# Altium integrated library WR-FPC_rev19a.IntLib: 242 symbols (part 1 of 2) (continued)
## 68712414022
designator J?
WR-FPC SMT ZIF Horizontal Top Contact, pitch 0.5mm, 24p; Part Number: 68712414022; Contact Resistance: 20mOhm; Pin Number: 24; Working Voltage: 50VAC; Rated Current: 0.5A; ComponentLink1Description: Manufacturer; ComponentLink1URL: http://www.we-online.de; ComponentLink2Description: Datasheet; ComponentLink2URL: https://katalog.we-online.com/em/datasheet/68712414022.pdf; Packaging: Tape and Reel; Pitch: 0.5mm; Published Date: November 2019; Mounting Technology: SMT; Operating Temperature: -25 to +85degC; Length: 18.4mm; Type: Horizontal; Publisher: Wurth Elektronik
footprint 68712414022
pins: 1, 2, 3, 4, 5, 6, 7, 8, 9, 10, 11, 12, 13, 14, 15, 16, 17, 18, 19, 20, 21, 22, 23, 24, MP1, MP2

## 68712414522
designator J?
WR-FPC SMT ZIF Horizontal Bottom Contact, pitch 0.5mm, 24p; Part Number: 68712414522; Contact Resistance: 20mOhm; Pin Number: 24; Working Voltage: 50VAC; Rated Current: 0.5A; ComponentLink1Description: Manufacturer; ComponentLink1URL: http://www.we-online.de; ComponentLink2Description: Datasheet; ComponentLink2URL: https://katalog.we-online.com/em/datasheet/68712414522.pdf; Packaging: Tape and Reel; Pitch: 0.5mm; Published Date: November 2019; Mounting Technology: SMT; Operating Temperature: -25 to +85degC; Length: 18.4mm; Type: Horizontal; Publisher: Wurth Elektronik
footprint 68712414522
pins: 1, 2, 3, 4, 5, 6, 7, 8, 9, 10, 11, 12, 13, 14, 15, 16, 17, 18, 19, 20, 21, 22, 23, 24, MP1, MP2

## 68712514022
designator J?
WR-FPC SMT ZIF Horizontal Top Contact, pitch 0.5mm, 25p; Part Number: 68712514022; Contact Resistance: 20mOhm; Pin Number: 25; Working Voltage: 50VAC; Rated Current: 0.5A; ComponentLink1Description: Manufacturer; ComponentLink1URL: http://www.we-online.de; ComponentLink2Description: Datasheet; ComponentLink2URL: https://katalog.we-online.com/em/datasheet/68712514022.pdf; Packaging: Tape and Reel; Pitch: 0.5mm; Published Date: November 2019; Mounting Technology: SMT; Operating Temperature: -25 to +85degC; Length: 18.9mm; Type: Horizontal; Publisher: Wurth Elektronik
footprint 68712514022
pins: 1, 2, 3, 4, 5, 6, 7, 8, 9, 10, 11, 12, 13, 14, 15, 16, 17, 18, 19, 20, 21, 22, 23, 24, 25, MP1, MP2

## 68712614022
designator J?
WR-FPC SMT ZIF Horizontal Top Contact, pitch 0.5mm, 26p; Part Number: 68712614022; Contact Resistance: 20mOhm; Pin Number: 26; Working Voltage: 50VAC; Rated Current: 0.5A; ComponentLink1Description: Manufacturer; ComponentLink1URL: http://www.we-online.de; ComponentLink2Description: Datasheet; ComponentLink2URL: https://katalog.we-online.com/em/datasheet/68712614022.pdf; Packaging: Tape and Reel; Pitch: 0.5mm; Published Date: November 2019; Mounting Technology: SMT; Operating Temperature: -25 to +85degC; Length: 19.4mm; Type: Horizontal; Publisher: Wurth Elektronik
footprint 68712614022
pins: 1, 2, 3, 4, 5, 6, 7, 8, 9, 10, 11, 12, 13, 14, 15, 16, 17, 18, 19, 20, 21, 22, 23, 24, 25, 26, MP1, MP2

## 68712614522
designator J?
WR-FPC SMT ZIF Horizontal Bottom Contact, pitch 0.5mm, 26p; Part Number: 68712614522; Contact Resistance: 20mOhm; Pin Number: 26; Working Voltage: 50VAC; Rated Current: 0.5A; ComponentLink1Description: Manufacturer; ComponentLink1URL: http://www.we-online.de; ComponentLink2Description: Datasheet; ComponentLink2URL: https://katalog.we-online.com/em/datasheet/68712614522.pdf; Packaging: Tape and Reel; Pitch: 0.5mm; Published Date: November 2019; Mounting Technology: SMT; Operating Temperature: -25 to +85degC; Length: 19.4mm; Type: Horizontal; Publisher: Wurth Elektronik
footprint 68712614522
pins: 1, 2, 3, 4, 5, 6, 7, 8, 9, 10, 11, 12, 13, 14, 15, 16, 17, 18, 19, 20, 21, 22, 23, 24, 25, 26, MP1, MP2

## 68712814022
designator J?
WR-FPC SMT ZIF Horizontal Top Contact, pitch 0.5mm, 28p; Part Number: 68712814022; Contact Resistance: 20mOhm; Pin Number: 28; Working Voltage: 50VAC; Rated Current: 0.5A; ComponentLink1Description: Manufacturer; ComponentLink1URL: http://www.we-online.de; ComponentLink2Description: Datasheet; ComponentLink2URL: https://katalog.we-online.com/em/datasheet/68712814022.pdf; Packaging: Tape and Reel; Pitch: 0.5mm; Published Date: November 2019; Mounting Technology: SMT; Operating Temperature: -25 to +85degC; Length: 20.4mm; Type: Horizontal; Publisher: Wurth Elektronik
footprint 68712814022
pins: 1, 2, 3, 4, 5, 6, 7, 8, 9, 10, 11, 12, 13, 14, 15, 16, 17, 18, 19, 20, 21, 22, 23, 24, 25, 26, 27, 28, MP1, MP2

## 68712814522
designator J?
WR-FPC SMT ZIF Horizontal Bottom Contact, pitch 0.5mm, 28p; Part Number: 68712814522; Contact Resistance: 20mOhm; Pin Number: 28; Working Voltage: 50VAC; Rated Current: 0.5A; ComponentLink1Description: Manufacturer; ComponentLink1URL: http://www.we-online.de; ComponentLink2Description: Datasheet; ComponentLink2URL: https://katalog.we-online.com/em/datasheet/68712814522.pdf; Packaging: Tape and Reel; Pitch: 0.5mm; Published Date: November 2019; Mounting Technology: SMT; Operating Temperature: -25 to +85degC; Length: 20.4mm; Type: Horizontal; Publisher: Wurth Elektronik
footprint 68712814522
pins: 1, 2, 3, 4, 5, 6, 7, 8, 9, 10, 11, 12, 13, 14, 15, 16, 17, 18, 19, 20, 21, 22, 23, 24, 25, 26, 27, 28, MP1, MP2

## 68713014022
designator J?
WR-FPC SMT ZIF Horizontal Top Contact, pitch 0.5mm, 30p; Part Number: 68713014022; Contact Resistance: 20mOhm; Pin Number: 30; Working Voltage: 50VAC; Rated Current: 0.5A; ComponentLink1Description: Manufacturer; ComponentLink1URL: http://www.we-online.de; ComponentLink2Description: Datasheet; ComponentLink2URL: https://katalog.we-online.com/em/datasheet/68713014022.pdf; Packaging: Tape and Reel; Pitch: 0.5mm; Published Date: November 2019; Mounting Technology: SMT; Operating Temperature: -25 to +85degC; Length: 21.4mm; Type: Horizontal; Publisher: Wurth Elektronik
footprint 68713014022
pins: 1, 2, 3, 4, 5, 6, 7, 8, 9, 10, 11, 12, 13, 14, 15, 16, 17, 18, 19, 20, 21, 22, 23, 24, 25, 26, 27, 28, 29, 30, MP1, MP2

## 68713014522
designator J?
WR-FPC SMT ZIF Horizontal Bottom Contact, pitch 0.5mm, 30p; Part Number: 68713014522; Contact Resistance: 20mOhm; Pin Number: 30; Working Voltage: 50VAC; Rated Current: 0.5A; ComponentLink1Description: Manufacturer; ComponentLink1URL: http://www.we-online.de; ComponentLink2Description: Datasheet; ComponentLink2URL: https://katalog.we-online.com/em/datasheet/68713014522.pdf; Packaging: Tape and Reel; Pitch: 0.5mm; Published Date: November 2019; Mounting Technology: SMT; Operating Temperature: -25 to +85degC; Length: 21.4mm; Type: Horizontal; Publisher: Wurth Elektronik
footprint 68713014522
pins: 1, 2, 3, 4, 5, 6, 7, 8, 9, 10, 11, 12, 13, 14, 15, 16, 17, 18, 19, 20, 21, 22, 23, 24, 25, 26, 27, 28, 29, 30, MP1, MP2

## 68713214022
designator J?
WR-FPC SMT ZIF Horizontal Top Contact, pitch 0.5mm, 32p; Part Number: 68713214022; Contact Resistance: 20mOhm; Pin Number: 32; Working Voltage: 50VAC; Rated Current: 0.5A; ComponentLink1Description: Manufacturer; ComponentLink1URL: http://www.we-online.de; ComponentLink2Description: Datasheet; ComponentLink2URL: https://katalog.we-online.com/em/datasheet/68713214022.pdf; Packaging: Tape and Reel; Pitch: 0.5mm; Published Date: November 2019; Mounting Technology: SMT; Operating Temperature: -25 to +85degC; Length: 22.4mm; Type: Horizontal; Publisher: Wurth Elektronik
footprint 68713214022
pins: 1, 2, 3, 4, 5, 6, 7, 8, 9, 10, 11, 12, 13, 14, 15, 16, 17, 18, 19, 20, 21, 22, 23, 24, 25, 26, 27, 28, 29, 30, 31, 32, MP1, MP2

## 68713214522
designator J?
WR-FPC SMT ZIF Horizontal Bottom Contact, pitch 0.5mm, 32p; Part Number: 68713214522; Contact Resistance: 20mOhm; Pin Number: 32; Working Voltage: 50VAC; Rated Current: 0.5A; ComponentLink1Description: Manufacturer; ComponentLink1URL: http://www.we-online.de; ComponentLink2Description: Datasheet; ComponentLink2URL: https://katalog.we-online.com/em/datasheet/68713214522.pdf; Packaging: Tape and Reel; Pitch: 0.5mm; Published Date: November 2019; Mounting Technology: SMT; Operating Temperature: -25 to +85degC; Length: 22.4mm; Type: Horizontal; Publisher: Wurth Elektronik
footprint 68713214522
pins: 1, 2, 3, 4, 5, 6, 7, 8, 9, 10, 11, 12, 13, 14, 15, 16, 17, 18, 19, 20, 21, 22, 23, 24, 25, 26, 27, 28, 29, 30, 31, 32, MP1, MP2

## 68713314022
designator J?
WR-FPC SMT ZIF Horizontal Top Contact, pitch 0.5mm, 33p; Part Number: 68713314022; Contact Resistance: 20mOhm; Pin Number: 33; Working Voltage: 50VAC; Rated Current: 0.5A; ComponentLink1Description: Manufacturer; ComponentLink1URL: http://www.we-online.de; ComponentLink2Description: Datasheet; ComponentLink2URL: https://katalog.we-online.com/em/datasheet/68713314022.pdf; Packaging: Tape and Reel; Pitch: 0.5mm; Published Date: November 2019; Mounting Technology: SMT; Operating Temperature: -25 to +85degC; Length: 22.9mm; Type: Horizontal; Publisher: Wurth Elektronik
footprint 68713314022
pins: 1, 2, 3, 4, 5, 6, 7, 8, 9, 10, 11, 12, 13, 14, 15, 16, 17, 18, 19, 20, 21, 22, 23, 24, 25, 26, 27, 28, 29, 30, 31, 32, 33, MP1, MP2

## 68713314522
designator J?
WR-FPC SMT ZIF Horizontal Bottom Contact, pitch 0.5mm, 33p; Part Number: 68713314522; Contact Resistance: 20mOhm; Pin Number: 33; Working Voltage: 50VAC; Rated Current: 0.5A; ComponentLink1Description: Manufacturer; ComponentLink1URL: http://www.we-online.de; ComponentLink2Description: Datasheet; ComponentLink2URL: https://katalog.we-online.com/em/datasheet/68713314522.pdf; Packaging: Tape and Reel; Pitch: 0.5mm; Published Date: November 2019; Mounting Technology: SMT; Operating Temperature: -25 to +85degC; Length: 22.9mm; Type: Horizontal; Publisher: Wurth Elektronik
footprint 68713314522
pins: 1, 2, 3, 4, 5, 6, 7, 8, 9, 10, 11, 12, 13, 14, 15, 16, 17, 18, 19, 20, 21, 22, 23, 24, 25, 26, 27, 28, 29, 30, 31, 32, 33, MP1, MP2

## 68713414022
designator J?
WR-FPC SMT ZIF Horizontal Top Contact, pitch 0.5mm, 34p; Part Number: 68713414022; Contact Resistance: 20mOhm; Pin Number: 34; Working Voltage: 50VAC; Rated Current: 0.5A; ComponentLink1Description: Manufacturer; ComponentLink1URL: http://www.we-online.de; ComponentLink2Description: Datasheet; ComponentLink2URL: https://katalog.we-online.com/em/datasheet/68713414022.pdf; Packaging: Tape and Reel; Pitch: 0.5mm; Published Date: November 2019; Mounting Technology: SMT; Operating Temperature: -25 to +85degC; Length: 23.4mm; Type: Horizontal; Publisher: Wurth Elektronik
footprint 68713414022
pins: 1, 2, 3, 4, 5, 6, 7, 8, 9, 10, 11, 12, 13, 14, 15, 16, 17, 18, 19, 20, 21, 22, 23, 24, 25, 26, 27, 28, 29, 30, 31, 32, 33, 34, MP1, MP2

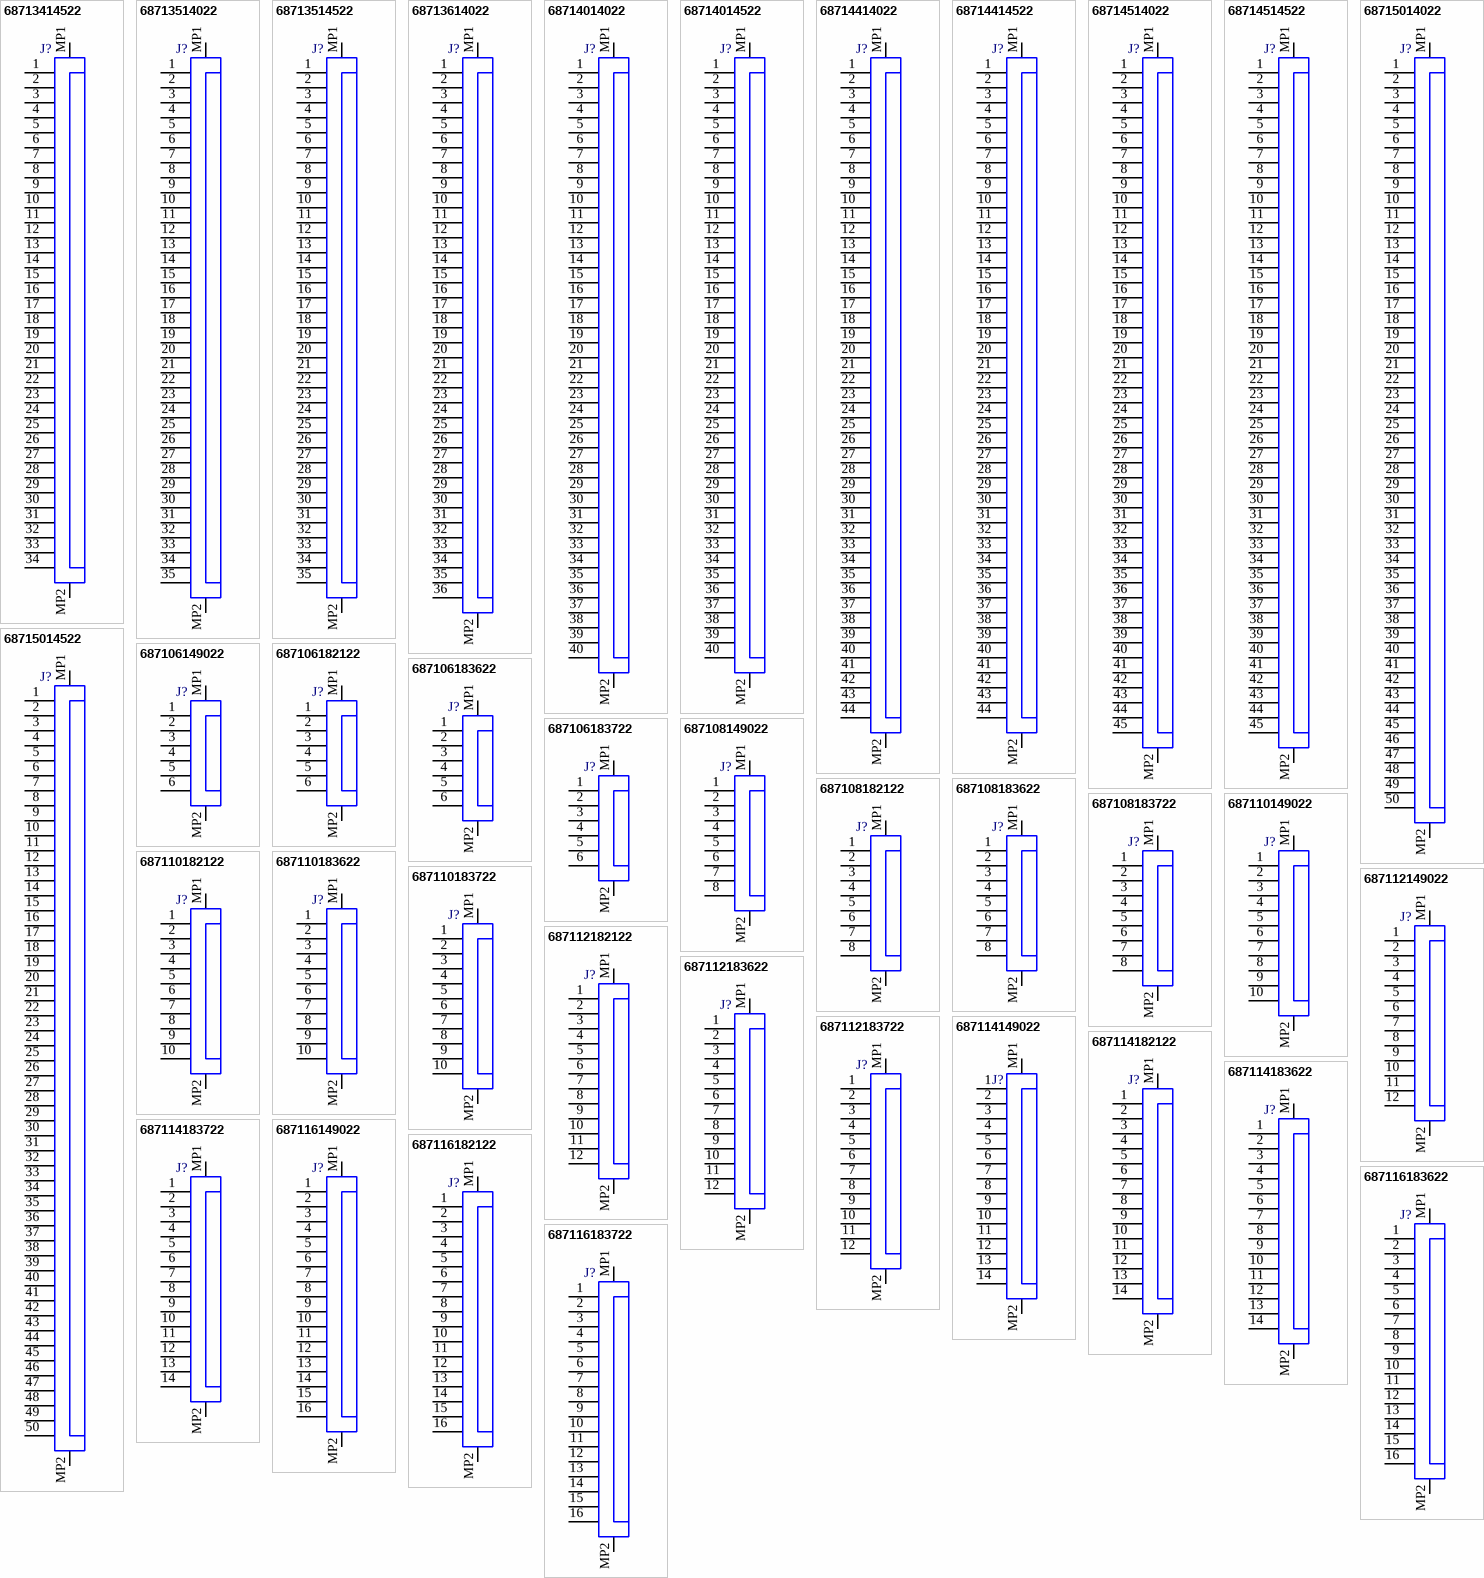
[diagram p4: symbols 68713414522 to 687116183722]

## 68713414522
designator J?
WR-FPC SMT ZIF Horizontal Bottom Contact, pitch 0.5mm, 34p; Part Number: 68713414522; Contact Resistance: 20mOhm; Pin Number: 34; Working Voltage: 50VAC; Rated Current: 0.5A; ComponentLink1Description: Manufacturer; ComponentLink1URL: http://www.we-online.de; ComponentLink2Description: Datasheet; ComponentLink2URL: https://katalog.we-online.com/em/datasheet/68713414522.pdf; Packaging: Tape and Reel; Pitch: 0.5mm; Published Date: November 2019; Mounting Technology: SMT; Operating Temperature: -25 to +85degC; Length: 23.4mm; Type: Horizontal; Publisher: Wurth Elektronik
footprint 68713414522
pins: 1, 2, 3, 4, 5, 6, 7, 8, 9, 10, 11, 12, 13, 14, 15, 16, 17, 18, 19, 20, 21, 22, 23, 24, 25, 26, 27, 28, 29, 30, 31, 32, 33, 34, MP1, MP2

## 68713514022
designator J?
WR-FPC SMT ZIF Horizontal Top Contact, pitch 0.5mm, 35p; Part Number: 68713514022; Contact Resistance: 20mOhm; Pin Number: 35; Working Voltage: 50VAC; Rated Current: 0.5A; ComponentLink1Description: Manufacturer; ComponentLink1URL: http://www.we-online.de; ComponentLink2Description: Datasheet; ComponentLink2URL: https://katalog.we-online.com/em/datasheet/68713514022.pdf; Packaging: Tape and Reel; Pitch: 0.5mm; Published Date: November 2019; Mounting Technology: SMT; Operating Temperature: -25 to +85degC; Length: 23.9mm; Type: Horizontal; Publisher: Wurth Elektronik
footprint 68713514022
pins: 1, 2, 3, 4, 5, 6, 7, 8, 9, 10, 11, 12, 13, 14, 15, 16, 17, 18, 19, 20, 21, 22, 23, 24, 25, 26, 27, 28, 29, 30, 31, 32, 33, 34, 35, MP1, MP2

## 68713514522
designator J?
WR-FPC SMT ZIF Horizontal Bottom Contact, pitch 0.5mm, 35p; Part Number: 68713514522; Contact Resistance: 20mOhm; Pin Number: 35; Working Voltage: 50VAC; Rated Current: 0.5A; ComponentLink1Description: Manufacturer; ComponentLink1URL: http://www.we-online.de; ComponentLink2Description: Datasheet; ComponentLink2URL: https://katalog.we-online.com/em/datasheet/68713514522.pdf; Packaging: Tape and Reel; Pitch: 0.5mm; Published Date: November 2019; Mounting Technology: SMT; Operating Temperature: -25 to +85degC; Length: 23.9mm; Type: Horizontal; Publisher: Wurth Elektronik
footprint 68713514522
pins: 1, 2, 3, 4, 5, 6, 7, 8, 9, 10, 11, 12, 13, 14, 15, 16, 17, 18, 19, 20, 21, 22, 23, 24, 25, 26, 27, 28, 29, 30, 31, 32, 33, 34, 35, MP1, MP2

## 68713614022
designator J?
WR-FPC SMT ZIF Horizontal Top Contact, pitch 0.5mm, 36p; Part Number: 68713614022; Contact Resistance: 20mOhm; Pin Number: 36; Working Voltage: 50VAC; Rated Current: 0.5A; ComponentLink1Description: Manufacturer; ComponentLink1URL: http://www.we-online.de; ComponentLink2Description: Datasheet; ComponentLink2URL: https://katalog.we-online.com/em/datasheet/68713614022.pdf; Packaging: Tape and Reel; Pitch: 0.5mm; Published Date: November 2019; Mounting Technology: SMT; Operating Temperature: -25 to +85degC; Length: 24.4mm; Type: Horizontal; Publisher: Wurth Elektronik
footprint 68713614022
pins: 1, 2, 3, 4, 5, 6, 7, 8, 9, 10, 11, 12, 13, 14, 15, 16, 17, 18, 19, 20, 21, 22, 23, 24, 25, 26, 27, 28, 29, 30, 31, 32, 33, 34, 35, 36, MP1, MP2

## 68714014022
designator J?
WR-FPC SMT ZIF Horizontal Top Contact, pitch 0.5mm, 40p; Part Number: 68714014022; Contact Resistance: 20mOhm; Pin Number: 40; Working Voltage: 50VAC; Rated Current: 0.5A; ComponentLink1Description: Manufacturer; ComponentLink1URL: http://www.we-online.de; ComponentLink2Description: Datasheet; ComponentLink2URL: https://katalog.we-online.com/em/datasheet/68714014022.pdf; Packaging: Tape and Reel; Pitch: 0.5mm; Published Date: November 2019; Mounting Technology: SMT; Operating Temperature: -25 to +85degC; Length: 26.4mm; Type: Horizontal; Publisher: Wurth Elektronik
footprint 68714014022
pins: 1, 2, 3, 4, 5, 6, 7, 8, 9, 10, 11, 12, 13, 14, 15, 16, 17, 18, 19, 20, 21, 22, 23, 24, 25, 26, 27, 28, 29, 30, 31, 32, 33, 34, 35, 36, 37, 38, 39, 40, MP1, MP2

## 68714014522
designator J?
WR-FPC SMT ZIF Horizontal Bottom Contact, pitch 0.5mm, 40p; Part Number: 68714014522; Contact Resistance: 20mOhm; Pin Number: 40; Working Voltage: 50VAC; Rated Current: 0.5A; ComponentLink1Description: Manufacturer; ComponentLink1URL: http://www.we-online.de; ComponentLink2Description: Datasheet; ComponentLink2URL: https://katalog.we-online.com/em/datasheet/68714014522.pdf; Packaging: Tape and Reel; Pitch: 0.5mm; Published Date: November 2019; Mounting Technology: SMT; Operating Temperature: -25 to +85degC; Length: 26.4mm; Type: Horizontal; Publisher: Wurth Elektronik
footprint 68714014522
pins: 1, 2, 3, 4, 5, 6, 7, 8, 9, 10, 11, 12, 13, 14, 15, 16, 17, 18, 19, 20, 21, 22, 23, 24, 25, 26, 27, 28, 29, 30, 31, 32, 33, 34, 35, 36, 37, 38, 39, 40, MP1, MP2

## 68714414022
designator J?
WR-FPC SMT ZIF Horizontal Top Contact, pitch 0.5mm, 44p; Part Number: 68714414022; Contact Resistance: 20mOhm; Pin Number: 44; Working Voltage: 50VAC; Rated Current: 0.5A; ComponentLink1Description: Manufacturer; ComponentLink1URL: http://www.we-online.de; ComponentLink2Description: Datasheet; ComponentLink2URL: https://katalog.we-online.com/em/datasheet/68714414022.pdf; Packaging: Tape and Reel; Pitch: 0.5mm; Published Date: November 2019; Mounting Technology: SMT; Operating Temperature: -25 to +85degC; Length: 28.4mm; Type: Horizontal; Publisher: Wurth Elektronik
footprint 68714414022
pins: 1, 2, 3, 4, 5, 6, 7, 8, 9, 10, 11, 12, 13, 14, 15, 16, 17, 18, 19, 20, 21, 22, 23, 24, 25, 26, 27, 28, 29, 30, 31, 32, 33, 34, 35, 36, 37, 38, 39, 40, 41, 42, 43, 44, MP1, MP2

## 68714414522
designator J?
WR-FPC SMT ZIF Horizontal Bottom Contact, pitch 0.5mm, 44p; Part Number: 68714414522; Contact Resistance: 20mOhm; Pin Number: 44; Working Voltage: 50VAC; Rated Current: 0.5A; ComponentLink1Description: Manufacturer; ComponentLink1URL: http://www.we-online.de; ComponentLink2Description: Datasheet; ComponentLink2URL: https://katalog.we-online.com/em/datasheet/68714414522.pdf; Packaging: Tape and Reel; Pitch: 0.5mm; Published Date: November 2019; Mounting Technology: SMT; Operating Temperature: -25 to +85degC; Length: 28.4mm; Type: Horizontal; Publisher: Wurth Elektronik
footprint 68714414522
pins: 1, 2, 3, 4, 5, 6, 7, 8, 9, 10, 11, 12, 13, 14, 15, 16, 17, 18, 19, 20, 21, 22, 23, 24, 25, 26, 27, 28, 29, 30, 31, 32, 33, 34, 35, 36, 37, 38, 39, 40, 41, 42, 43, 44, MP1, MP2

## 68714514022
designator J?
WR-FPC SMT ZIF Horizontal Top Contact, pitch 0.5mm, 45p; Part Number: 68714514022; Contact Resistance: 20mOhm; Pin Number: 45; Working Voltage: 50VAC; Rated Current: 0.5A; ComponentLink1Description: Manufacturer; ComponentLink1URL: http://www.we-online.de; ComponentLink2Description: Datasheet; ComponentLink2URL: https://katalog.we-online.com/em/datasheet/68714514022.pdf; Packaging: Tape and Reel; Pitch: 0.5mm; Published Date: November 2019; Mounting Technology: SMT; Operating Temperature: -25 to +85degC; Length: 28.9mm; Type: Horizontal; Publisher: Wurth Elektronik
footprint 68714514022
pins: 1, 2, 3, 4, 5, 6, 7, 8, 9, 10, 11, 12, 13, 14, 15, 16, 17, 18, 19, 20, 21, 22, 23, 24, 25, 26, 27, 28, 29, 30, 31, 32, 33, 34, 35, 36, 37, 38, 39, 40, 41, 42, 43, 44, 45, MP1, MP2

## 68714514522
designator J?
WR-FPC SMT ZIF Horizontal Bottom Contact, pitch 0.5mm, 45p; Part Number: 68714514522; Contact Resistance: 20mOhm; Pin Number: 45; Working Voltage: 50VAC; Rated Current: 0.5A; ComponentLink1Description: Manufacturer; ComponentLink1URL: http://www.we-online.de; ComponentLink2Description: Datasheet; ComponentLink2URL: https://katalog.we-online.com/em/datasheet/68714514522.pdf; Packaging: Tape and Reel; Pitch: 0.5mm; Published Date: November 2019; Mounting Technology: SMT; Operating Temperature: -25 to +85degC; Length: 28.9mm; Type: Horizontal; Publisher: Wurth Elektronik
footprint 68714514522
pins: 1, 2, 3, 4, 5, 6, 7, 8, 9, 10, 11, 12, 13, 14, 15, 16, 17, 18, 19, 20, 21, 22, 23, 24, 25, 26, 27, 28, 29, 30, 31, 32, 33, 34, 35, 36, 37, 38, 39, 40, 41, 42, 43, 44, 45, MP1, MP2

## 68715014022
designator J?
WR-FPC SMT ZIF Horizontal Top Contact, pitch 0.5mm, 50p; Part Number: 68715014022; Contact Resistance: 20mOhm; Pin Number: 50; Working Voltage: 50VAC; Rated Current: 0.5A; ComponentLink1Description: Manufacturer; ComponentLink1URL: http://www.we-online.de; ComponentLink2Description: Datasheet; ComponentLink2URL: https://katalog.we-online.com/em/datasheet/68715014022.pdf; Packaging: Tape and Reel; Pitch: 0.5mm; Published Date: November 2019; Mounting Technology: SMT; Operating Temperature: -25 to +85degC; Length: 31.4mm; Type: Horizontal; Publisher: Wurth Elektronik
footprint 68715014022
pins: 1, 2, 3, 4, 5, 6, 7, 8, 9, 10, 11, 12, 13, 14, 15, 16, 17, 18, 19, 20, 21, 22, 23, 24, 25, 26, 27, 28, 29, 30, 31, 32, 33, 34, 35, 36, 37, 38, 39, 40, 41, 42, 43, 44, 45, 46, 47, 48, 49, 50, MP1, MP2

## 68715014522
designator J?
WR-FPC SMT ZIF Horizontal Bottom Contact, pitch 0.5mm, 50p; Part Number: 68715014522; Contact Resistance: 20mOhm; Pin Number: 50; Working Voltage: 50VAC; Rated Current: 0.5A; ComponentLink1Description: Manufacturer; ComponentLink1URL: http://www.we-online.de; ComponentLink2Description: Datasheet; ComponentLink2URL: https://katalog.we-online.com/em/datasheet/68715014522.pdf; Packaging: Tape and Reel; Pitch: 0.5mm; Published Date: November 2019; Mounting Technology: SMT; Operating Temperature: -25 to +85degC; Length: 31.4mm; Type: Horizontal; Publisher: Wurth Elektronik
footprint 68715014522
pins: 1, 2, 3, 4, 5, 6, 7, 8, 9, 10, 11, 12, 13, 14, 15, 16, 17, 18, 19, 20, 21, 22, 23, 24, 25, 26, 27, 28, 29, 30, 31, 32, 33, 34, 35, 36, 37, 38, 39, 40, 41, 42, 43, 44, 45, 46, 47, 48, 49, 50, MP1, MP2

## 687106149022
designator J?
WR-FPC SMT ZIF Horizontal Bottom Contact, pitch 0.5mm, 6p; Part Number: 687106149022; Contact Resistance: 50mOhm; Pin Number: 6; Working Voltage: 50VAC; Rated Current: 0.5A; ComponentLink1Description: Manufacturer; ComponentLink1URL: http://www.we-online.de; ComponentLink2Description: Datasheet; ComponentLink2URL: https://katalog.we-online.com/em/datasheet/687106149022.pdf; Packaging: Tape and Reel; Pitch: 0.5mm; Published Date: November 2019; Mounting Technology: SMT; Operating Temperature: -25 to +85degC; Length: 7.1mm; Type: Horizontal; Publisher: Wurth Elektronik
footprint 687106149022
pins: 1, 2, 3, 4, 5, 6, MP1, MP2

## 687106182122
designator J?
WR-FPC SMT ZIF Horizontal Dual Contact, pitch 0.5mm, 6p; Part Number: 687106182122; Contact Resistance: 30mOhm; Pin Number: 6; Working Voltage: 50VAC; Rated Current: 0.5A; ComponentLink1Description: Manufacturer; ComponentLink1URL: http://www.we-online.de; ComponentLink2Description: Datasheet; ComponentLink2URL: https://katalog.we-online.com/em/datasheet/687106182122.pdf; Packaging: Tape and Reel; Pitch: 0.5mm; Published Date: November 2019; Mounting Technology: SMT; Operating Temperature: -25 to +85degC; Length: 5mm; Type: Horizontal; Publisher: Wurth Elektronik
footprint 687106182122
pins: 1, 2, 3, 4, 5, 6, MP1, MP2

## 687106183622
designator J?
WR-FPC SMT ZIF Horizontal Top Contact Low Profile, pitch 0.5mm, 6p; Part Number: 687106183622; Contact Resistance: 30mOhm; Pin Number: 6; Working Voltage: 50VAC; Rated Current: 0.4A; ComponentLink1Description: Manufacturer; ComponentLink1URL: http://www.we-online.de; ComponentLink2Description: Datasheet; ComponentLink2URL: https://katalog.we-online.com/em/datasheet/687106183622.pdf; Packaging: Tape and Reel; Pitch: 0.5mm; Published Date: November 2019; Mounting Technology: SMT; Operating Temperature: -25 to +85degC; Length: 8.7mm; Type: Horizontal; Publisher: Wurth Elektronik
footprint 687106183622
pins: 1, 2, 3, 4, 5, 6, MP1, MP2

## 687106183722
designator J?
WR-FPC SMT ZIF Horizontal Bottom Contact Low Profile, pitch 0.5mm, 6p; Part Number: 687106183722; Contact Resistance: 30mOhm; Pin Number: 6; Working Voltage: 50VAC; Rated Current: 0.4A; ComponentLink1Description: Manufacturer; ComponentLink1URL: http://www.we-online.de; ComponentLink2Description: Datasheet; ComponentLink2URL: https://katalog.we-online.com/em/datasheet/687106183722.pdf; Packaging: Tape and Reel; Pitch: 0.5mm; Published Date: November 2019; Mounting Technology: SMT; Operating Temperature: -25 to +85degC; Length: 8.7mm; Type: Horizontal; Publisher: Wurth Elektronik
footprint 687106183722
pins: 1, 2, 3, 4, 5, 6, MP1, MP2

## 687108149022
designator J?
WR-FPC SMT ZIF Horizontal Bottom Contact, pitch 0.5mm, 8p; Part Number: 687108149022; Contact Resistance: 50mOhm; Pin Number: 8; Working Voltage: 50VAC; Rated Current: 0.5A; ComponentLink1Description: Manufacturer; ComponentLink1URL: http://www.we-online.de; ComponentLink2Description: Datasheet; ComponentLink2URL: https://katalog.we-online.com/em/datasheet/687108149022.pdf; Packaging: Tape and Reel; Pitch: 0.5mm; Published Date: November 2019; Mounting Technology: SMT; Operating Temperature: -25 to +85degC; Length: 8.1mm; Type: Horizontal; Publisher: Wurth Elektronik
footprint 687108149022
pins: 1, 2, 3, 4, 5, 6, 7, 8, MP1, MP2

## 687108182122
designator J?
WR-FPC SMT ZIF Horizontal Dual Contact, pitch 0.5mm, 8p; Part Number: 687108182122; Contact Resistance: 30mOhm; Pin Number: 8; Working Voltage: 50VAC; Rated Current: 0.5A; ComponentLink1Description: Manufacturer; ComponentLink1URL: http://www.we-online.de; ComponentLink2Description: Datasheet; ComponentLink2URL: https://katalog.we-online.com/em/datasheet/687108182122.pdf; Packaging: Tape and Reel; Pitch: 0.5mm; Published Date: November 2019; Mounting Technology: SMT; Operating Temperature: -25 to +85degC; Length: 6mm; Type: Horizontal; Publisher: Wurth Elektronik
footprint 687108182122
pins: 1, 2, 3, 4, 5, 6, 7, 8, MP1, MP2

## 687108183622
designator J?
WR-FPC SMT ZIF Horizontal Top Contact Low Profile, pitch 0.5mm, 8p; Part Number: 687108183622; Contact Resistance: 30mOhm; Pin Number: 8; Working Voltage: 50VAC; Rated Current: 0.4A; ComponentLink1Description: Manufacturer; ComponentLink1URL: http://www.we-online.de; ComponentLink2Description: Datasheet; ComponentLink2URL: https://katalog.we-online.com/em/datasheet/687108183622.pdf; Packaging: Tape and Reel; Pitch: 0.5mm; Published Date: November 2019; Mounting Technology: SMT; Operating Temperature: -25 to +85degC; Length: 9.7mm; Type: Horizontal; Publisher: Wurth Elektronik
footprint 687108183622
pins: 1, 2, 3, 4, 5, 6, 7, 8, MP1, MP2

## 687108183722
designator J?
WR-FPC SMT ZIF Horizontal Bottom Contact Low Profile, pitch 0.5mm, 8p; Part Number: 687108183722; Contact Resistance: 30mOhm; Pin Number: 8; Working Voltage: 50VAC; Rated Current: 0.4A; ComponentLink1Description: Manufacturer; ComponentLink1URL: http://www.we-online.de; ComponentLink2Description: Datasheet; ComponentLink2URL: https://katalog.we-online.com/em/datasheet/687108183722.pdf; Packaging: Tape and Reel; Pitch: 0.5mm; Published Date: November 2019; Mounting Technology: SMT; Operating Temperature: -25 to +85degC; Length: 9.7mm; Type: Horizontal; Publisher: Wurth Elektronik
footprint 687108183722
pins: 1, 2, 3, 4, 5, 6, 7, 8, MP1, MP2

## 687110149022
designator J?
WR-FPC SMT ZIF Horizontal Bottom Contact, pitch 0.5mm, 10p; Part Number: 687110149022; Contact Resistance: 50mOhm; Pin Number: 10; Working Voltage: 50VAC; Rated Current: 0.5A; ComponentLink1Description: Manufacturer; ComponentLink1URL: http://www.we-online.de; ComponentLink2Description: Datasheet; ComponentLink2URL: https://katalog.we-online.com/em/datasheet/687110149022.pdf; Packaging: Tape and Reel; Pitch: 0.5mm; Published Date: November 2019; Mounting Technology: SMT; Operating Temperature: -25 to +85degC; Length: 9.1mm; Type: Horizontal; Publisher: Wurth Elektronik
footprint 687110149022
pins: 1, 2, 3, 4, 5, 6, 7, 8, 9, 10, MP1, MP2

## 687110182122
designator J?
WR-FPC SMT ZIF Horizontal Dual Contact, pitch 0.5mm, 10p; Part Number: 687110182122; Contact Resistance: 30mOhm; Pin Number: 10; Working Voltage: 50VAC; Rated Current: 0.5A; ComponentLink1Description: Manufacturer; ComponentLink1URL: http://www.we-online.de; ComponentLink2Description: Datasheet; ComponentLink2URL: https://katalog.we-online.com/em/datasheet/687110182122.pdf; Packaging: Tape and Reel; Pitch: 0.5mm; Published Date: November 2019; Mounting Technology: SMT; Operating Temperature: -25 to +85degC; Length: 7mm; Type: Horizontal; Publisher: Wurth Elektronik
footprint 687110182122
pins: 1, 2, 3, 4, 5, 6, 7, 8, 9, 10, MP1, MP2

## 687110183622
designator J?
WR-FPC SMT ZIF Horizontal Top Contact Low Profile, pitch 0.5mm, 10p; Part Number: 687110183622; Contact Resistance: 30mOhm; Pin Number: 10; Working Voltage: 50VAC; Rated Current: 0.4A; ComponentLink1Description: Manufacturer; ComponentLink1URL: http://www.we-online.de; ComponentLink2Description: Datasheet; ComponentLink2URL: https://katalog.we-online.com/em/datasheet/687110183622.pdf; Packaging: Tape and Reel; Pitch: 0.5mm; Published Date: November 2019; Mounting Technology: SMT; Operating Temperature: -25 to +85degC; Length: 10.7mm; Type: Horizontal; Publisher: Wurth Elektronik
footprint 687110183622
pins: 1, 2, 3, 4, 5, 6, 7, 8, 9, 10, MP1, MP2

## 687110183722
designator J?
WR-FPC SMT ZIF Horizontal Bottom Contact Low Profile, pitch 0.5mm, 10p; Part Number: 687110183722; Contact Resistance: 30mOhm; Pin Number: 10; Working Voltage: 50VAC; Rated Current: 0.4A; ComponentLink1Description: Manufacturer; ComponentLink1URL: http://www.we-online.de; ComponentLink2Description: Datasheet; ComponentLink2URL: https://katalog.we-online.com/em/datasheet/687110183722.pdf; Packaging: Tape and Reel; Pitch: 0.5mm; Published Date: November 2019; Mounting Technology: SMT; Operating Temperature: -25 to +85degC; Length: 10.7mm; Type: Horizontal; Publisher: Wurth Elektronik
footprint 687110183722
pins: 1, 2, 3, 4, 5, 6, 7, 8, 9, 10, MP1, MP2

## 687112149022
designator J?
WR-FPC SMT ZIF Horizontal Bottom Contact, pitch 0.5mm, 12p; Part Number: 687112149022; Contact Resistance: 50mOhm; Pin Number: 12; Working Voltage: 50VAC; Rated Current: 0.5A; ComponentLink1Description: Manufacturer; ComponentLink1URL: http://www.we-online.de; ComponentLink2Description: Datasheet; ComponentLink2URL: https://katalog.we-online.com/em/datasheet/687112149022.pdf; Packaging: Tape and Reel; Pitch: 0.5mm; Published Date: November 2019; Mounting Technology: SMT; Operating Temperature: -25 to +85degC; Length: 10.1mm; Type: Horizontal; Publisher: Wurth Elektronik
footprint 687112149022
pins: 1, 2, 3, 4, 5, 6, 7, 8, 9, 10, 11, 12, MP1, MP2

## 687112182122
designator J?
WR-FPC SMT ZIF Horizontal Dual Contact, pitch 0.5mm, 12p; Part Number: 687112182122; Contact Resistance: 30mOhm; Pin Number: 12; Working Voltage: 50VAC; Rated Current: 0.5A; ComponentLink1Description: Manufacturer; ComponentLink1URL: http://www.we-online.de; ComponentLink2Description: Datasheet; ComponentLink2URL: https://katalog.we-online.com/em/datasheet/687112182122.pdf; Packaging: Tape and Reel; Pitch: 0.5mm; Published Date: November 2019; Mounting Technology: SMT; Operating Temperature: -25 to +85degC; Length: 8mm; Type: Horizontal; Publisher: Wurth Elektronik
footprint 687112182122
pins: 1, 2, 3, 4, 5, 6, 7, 8, 9, 10, 11, 12, MP1, MP2